# Altium footprint library My Footprint 3D.PCBLIB: 447 footprints (part 13 of 29)
Each footprint in its own frame and in the unit in brackets; x right, y up, seen from the top. Pads: shape width x height; smd on the part's side, far side on the other; paste and mask are expansions set on the pad; w line width, h text height; cw(c..) or ccw(c..) is an arc to the next point about the centre after c.
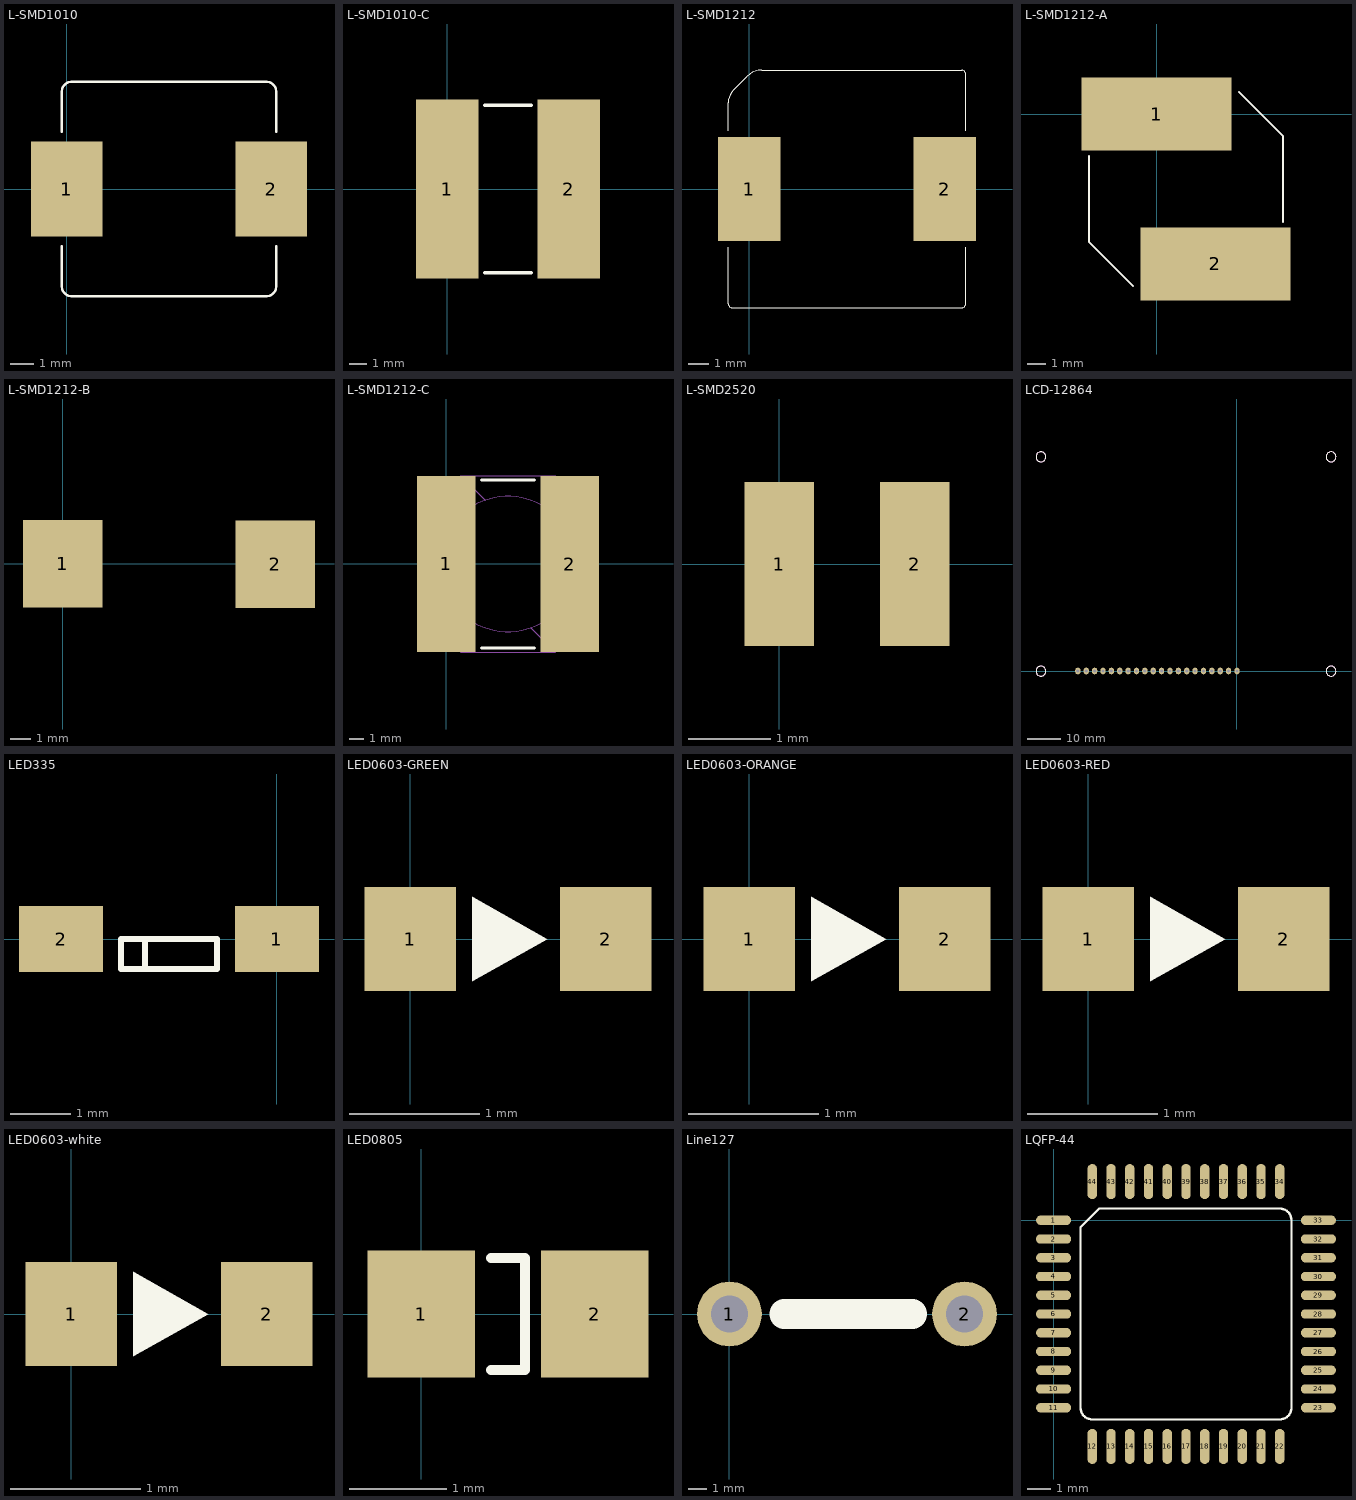
[diagram p12: the footprints below, top view; thin cyan lines are the x and y axes]

## L-SMD1010 [mm]
pads (2):
  rect 3x4 smd: 1(0,0) 2(8.6,0)
Top Overlay:
  lines w0.1: -0.2,-2.4 -0.2,-4.1 ccw(c0.2,-4.1) 0.2,-4.5 8.4,-4.5 ccw(c8.4,-4.1) 8.8,-4.1 8.8,-2.4 ; -0.2,2.4 -0.2,4.1 cw(c0.2,4.1) 0.2,4.5 8.4,4.5 cw(c8.4,4.1) 8.8,4.1 8.8,2.4
3D body: height 3, standoff 0, extent 9.35,-1.7 9.7,1.7
3D body: height 3, standoff 0, extent -1.1,-1.7 -0.75,1.7
3D body: height 4, standoff 0.1, extent -0.75,-5.05 9.35,5.05

## L-SMD1010-C [mm]
pads (2):
  rect 3.5x10 smd: 1(0,0) 2(6.8,0)
Top Overlay:
  lines w0.2: 2.1,-4.7 4.7,-4.7 ; 2.1,4.7 4.7,4.7
3D body: height 6.7, standoff 0.1, extent -0.625,-4.025 4.55,1.15
3D body: height 6.7, standoff 0.1, extent 2.25,-1.15 7.425,4.025
3D body: height 6.8, standoff 0.1, extent -1.6,-5 5.7,2.3
3D body: height 5, standoff 0.1, extent -1.6,1.15 2.25,5
3D body: height 5.2, standoff 4, extent -1.2,1.95 1.45,4.6
3D body: height 5.2, standoff 0.1, extent -1.2,2.75 0.65,4.6
3D body: height 5.2, standoff 0.1, extent 6.15,-4.6 8,-2.75
3D body: height 5.2, standoff 4, extent 5.35,-4.6 8,-1.95
3D body: height 5, standoff 0.1, extent 4.55,-5 8.4,-1.15
3D body: height 6.8, standoff 0.1, extent 1.1,-2.3 8.4,5
3D body: height 6.8, standoff 0, extent -0.396,-3.799 7.2,3.799

## L-SMD1212 [mm] "SMD  Inductance,Body 12mmX12mm"
height 10
pads (2):
  rect 3x5 smd: 1(0,0) 2(9.4,0)
Top Overlay:
  lines w0.05: -1,-2.8 -1,-5.5 ccw(c-0.8,-5.5) -0.8,-5.7 10.2,-5.7 ccw(c10.2,-5.5) 10.4,-5.5 10.4,-2.8 ; -1,2.8 -1,4.15 cw(c-0.155,4.15) -0.753,4.747 -0.083,5.417 cw(c0.6,4.734) 0.6,5.7 10.2,5.7 cw(c10.2,5.5) 10.4,5.5 10.4,2.8
3D body: height 1, standoff -0.01, extent -1.398,-6.098 10.798,6.098
3D body: height 7.5, standoff 0, extent -1.393,-6.098 10.8,6.099
3D body: height 7.51, standoff 0, extent -0.558,-5.289 10,5.29
3D body: height 7.52, standoff 0, extent 0.136,-4.591 9.3,4.591
3D body: height 1.2, standoff 0, extent -1.45,-1.75 0.05,1.75
3D body: height 1.2, standoff 0, extent 9.35,-1.75 10.85,1.75

## L-SMD1212-A [mm]
pads (2):
  rect 8.2x4 smd: 1(0,0) 2(3.2,-8.2)
Top Overlay:
  lines w0.1: -3.7,-2.3 -3.7,-7 -1.3,-9.4 ; 4.5,1.2 6.9,-1.2 6.9,-5.9
3D body: height 5.2, standoff 0.1, extent 4.8,-10.175 7.675,-7.3
3D body: height 7.7, standoff 0.1, extent -3.175,-8.875 3.275,-2.425
3D body: height 7.7, standoff 0.1, extent -0.075,-5.775 6.375,0.675
3D body: height 5, standoff 0.1, extent -4.4,-2.425 -0.075,1.9
3D body: height 5.2, standoff 5, extent -4.475,-2.175 -0.325,1.975
3D body: height 5.2, standoff 0.1, extent -4.475,-0.9 -1.6,1.975
3D body: height 5, standoff 0.1, extent 3.275,-10.1 7.6,-5.775
3D body: height 5.2, standoff 5, extent 3.525,-10.175 7.675,-6.025
3D body: height 7.8, standoff 0, extent -2.999,-8.695 6.199,0.5
3D body: height 7.7, standoff 0.1, extent -4.4,-10.1 4.8,-0.9
3D body: height 7.7, standoff 0.1, extent -1.6,-7.3 7.6,1.9

## L-SMD1212-B [mm]
pads (2):
  rect 3.8x4.2 smd: 1(0,0) 2(10.2,0)
3D body: height 2.4, standoff 0, extent 11.5,-2.1 11.9,2.1
3D body: height 0.3, standoff 0, extent 8.4,-2.1 11.9,2.1
3D body: height 0.3, standoff 0, extent -1.7,-2.1 1.8,2.1
3D body: height 2.4, standoff 0, extent -1.7,-2.1 -1.3,2.1
3D body: height 6, standoff 0.1, extent -1.3,-6.4 11.5,6.4

## L-SMD1212-C [mm]
pads (2):
  rect 4x12 smd: 1(0,0) 2(8.4,0)
Top Overlay:
  lines w0.2: 2.4,-5.7 6,-5.7 ; 2.4,5.7 6,5.7
Mechanical 1:
  circle w0.05: c4.2,0 r4.6
  lines w0.05: -0.15,1.55 -1.8,3.2 ; -0.125,1.525 -1.8,3.2 ; 5.75,-4.35 7.4,-6 ; 8.55,-1.55 10.2,-3.2 ; -1.8,3.2 1,6 ; -1.8,3.2 1,6 ; -1.8,3.2 -1.8,-3.2 1,-6 7.4,-6 ; 1,6 2.65,4.35 1,6 ; 1,6 7.4,6 10.2,3.2 10.2,-3.2 ; 7.4,-6 10.2,-3.2
3D body: height 7.7, standoff 0.1, extent -0.575,-4.775 5.875,1.675
3D body: height 7.7, standoff 0.1, extent 2.525,-1.675 8.975,4.775
3D body: height 5, standoff 0.1, extent -1.8,1.675 2.525,6
3D body: height 5.2, standoff 5, extent -1.875,1.925 2.275,6.075
3D body: height 5.2, standoff 0.1, extent -1.875,3.2 1,6.075
3D body: height 5, standoff 0.1, extent 5.875,-6 10.2,-1.675
3D body: height 5.2, standoff 5, extent 6.125,-6.075 10.275,-1.925
3D body: height 5.2, standoff 0.1, extent 7.4,-6.075 10.275,-3.2
3D body: height 7.8, standoff 0, extent -0.399,-4.595 8.799,4.6
3D body: height 7.7, standoff 0.1, extent -1.8,-6 7.4,3.2
3D body: height 7.7, standoff 0.1, extent 1,-3.2 10.2,6

## L-SMD2520 [mm]
height 1.2
pads (2):
  rect 0.85x2 smd: 1(0,0) 2(1.65,0)
3D body: height 0.9, standoff 0.4, extent -0.2,-0.875 1.875,0.875
3D body: height 1.2, standoff 0.9, extent -0.475,-1.1 2.125,1.1
3D body: height 0.4, standoff 0, extent -0.475,-1.1 2.125,1.1

## LCD-12864 [mm]
pads (20):
  oval 1.6x2 hole 1: 1(0,0) 2(-2.54,0) 3(-5.08,0) 4(-7.62,0) 5(-10.16,0) 6(-12.7,0) 7(-15.24,0) 8(-17.78,0) 9(-20.32,0) 10(-22.86,0) 11(-25.4,0) 12(-27.94,0) 13(-30.48,0) 14(-33.02,0) 15(-35.56,0) 16(-38.1,0) 17(-40.64,0) 18(-43.18,0) 19(-45.72,0) 20(-48.26,0)
Top Overlay:
  circle w0.2: c-59.46,-0.04 r1.5
  circle w0.2: c28.54,-0.04 r1.5
  circle w0.2: c28.54,64.96 r1.5
  circle w0.2: c-59.46,64.96 r1.5
Keep-Out Layer:
  circle w0.2: c-59.46,-0.04 r1.5
  circle w0.2: c28.54,-0.04 r1.5
  circle w0.2: c28.54,64.96 r1.5
  circle w0.2: c-59.46,64.96 r1.5
3D body: height 15.2, standoff 6.6, extent -54.465,32.71 24.05,58.47
3D body: height 15.2, standoff 6.6, extent -54.47,6.95 24.045,32.71
3D body: height 14.7, standoff 6.6, extent -51.71,13.21 21.29,52.21
3D body: height 6.6, standoff 5, extent -61.96,-2.54 31.04,67.46
3D body: height 6.7, standoff 4.9, extent -0.9,-1.1 0.9,1.1
3D body: height 7.7, standoff -2, extent -0.4,-0.4 0.4,0.4
3D body: height 7.7, standoff -2, extent -2.94,-0.4 -2.14,0.4
3D body: height 6.7, standoff 4.9, extent -3.44,-1.1 -1.64,1.1
3D body: height 7.7, standoff -2, extent -5.48,-0.4 -4.68,0.4
3D body: height 6.7, standoff 4.9, extent -5.98,-1.1 -4.18,1.1
3D body: height 7.7, standoff -2, extent -8.02,-0.4 -7.22,0.4
3D body: height 6.7, standoff 4.9, extent -8.52,-1.1 -6.72,1.1
3D body: height 7.7, standoff -2, extent -10.56,-0.4 -9.76,0.4
3D body: height 6.7, standoff 4.9, extent -11.06,-1.1 -9.26,1.1
3D body: height 7.7, standoff -2, extent -13.1,-0.4 -12.3,0.4
3D body: height 6.7, standoff 4.9, extent -13.6,-1.1 -11.8,1.1
3D body: height 7.7, standoff -2, extent -15.64,-0.4 -14.84,0.4
3D body: height 6.7, standoff 4.9, extent -16.14,-1.1 -14.34,1.1
3D body: height 7.7, standoff -2, extent -18.18,-0.4 -17.38,0.4
3D body: height 6.7, standoff 4.9, extent -18.68,-1.1 -16.88,1.1
3D body: height 7.7, standoff -2, extent -20.72,-0.4 -19.92,0.4
3D body: height 6.7, standoff 4.9, extent -21.22,-1.1 -19.42,1.1
3D body: height 7.7, standoff -2, extent -23.26,-0.4 -22.46,0.4
3D body: height 6.7, standoff 4.9, extent -23.76,-1.1 -21.96,1.1
3D body: height 7.7, standoff -2, extent -25.8,-0.4 -25,0.4
3D body: height 6.7, standoff 4.9, extent -26.3,-1.1 -24.5,1.1
3D body: height 7.7, standoff -2, extent -28.34,-0.4 -27.54,0.4
3D body: height 6.7, standoff 4.9, extent -28.84,-1.1 -27.04,1.1
3D body: height 7.7, standoff -2, extent -30.88,-0.4 -30.08,0.4
3D body: height 6.7, standoff 4.9, extent -31.38,-1.1 -29.58,1.1
3D body: height 7.7, standoff -2, extent -33.42,-0.4 -32.62,0.4
3D body: height 6.7, standoff 4.9, extent -33.92,-1.1 -32.12,1.1
3D body: height 7.7, standoff -2, extent -35.96,-0.4 -35.16,0.4
3D body: height 6.7, standoff 4.9, extent -36.46,-1.1 -34.66,1.1
3D body: height 7.7, standoff -2, extent -38.5,-0.4 -37.7,0.4
3D body: height 6.7, standoff 4.9, extent -39,-1.1 -37.2,1.1
3D body: height 7.7, standoff -2, extent -41.04,-0.4 -40.24,0.4
3D body: height 6.7, standoff 4.9, extent -41.54,-1.1 -39.74,1.1
3D body: height 7.7, standoff -2, extent -43.58,-0.4 -42.78,0.4
3D body: height 6.7, standoff 4.9, extent -44.08,-1.1 -42.28,1.1
3D body: height 7.7, standoff -2, extent -46.12,-0.4 -45.32,0.4
3D body: height 6.7, standoff 4.9, extent -46.62,-1.1 -44.82,1.1
3D body: height 7.7, standoff -2, extent -48.66,-0.4 -47.86,0.4
3D body: height 6.7, standoff 4.9, extent -49.16,-1.1 -47.36,1.1
3D body: height 9.6, standoff 6.6, extent 24.04,10.46 31.04,54.46

## LED335 [mm]
pads (2):
  rect 1.4x1.1 smd: 1(0,0) 2(-3.6,0)
Top Overlay:
  lines w0.1: -2.2,-0.5 -2.2,0 ; -2.6,-0.5 -2.6,0 -1,0 -1,-0.5 -2.6,-0.5
3D body: height 0.6, standoff 0.2, extent -2,-0.5 -1.6,-0.2
3D body: height 0.6, standoff 0.1, extent -3.8,-0.4 -3.2,-0.2
3D body: height 0.6, standoff 0.1, extent -0.4,-0.4 0.2,-0.2
3D body: height 0.7, standoff 0.1, extent -2.8,-1 -0.8,-0.2
3D body: height 0.8, standoff 0, extent -3.2,-1 -0.4,0.4
3D body: height 0.8, standoff 0.7, extent -3.2,-1 -0.4,0.4
3D body: height 0.2, standoff 0, extent -3.8,-0.4 -3.2,0.4
3D body: height 0.2, standoff 0, extent -0.4,-0.4 0.2,0.4
3D body: height 0.1, standoff 0, extent -3.2,-1 -0.4,0.4

## LED0603-GREEN [mm]
pads (2):
  rect 0.7x0.8 smd: 1(0,0) 2(1.5,0)
Top Overlay:
  region: 0.475,0.325 0.475,-0.325 1.05,0
3D body: height 0.38, standoff 0.32, extent 0.7,-0.042 0.962,0.307
3D body: height 0.35, standoff 0.2, extent 0.895,0.245 0.955,0.305
3D body: height 0.35, standoff 0.3, extent 0.72,-0.03 0.78,0.03
3D body: height 0.3, standoff 0.2, extent 0.65,-0.1 0.85,0.1
3D body: height 0.21, standoff 0.2, extent 0.525,-0.375 1.55,0.375
3D body: height 0.21, standoff 0.2, extent -0.05,-0.375 0.95,0.377
3D body: height 0.2, standoff 0, extent 0.75,-0.4 1.55,0.4
3D body: height 0.65, standoff 0.21, extent 0.225,-0.4 1.225,0.4
3D body: height 0.2, standoff 0, extent -0.05,-0.4 0.75,0.4

## LED0603-ORANGE [mm]
pads (2):
  rect 0.7x0.8 smd: 1(0,0) 2(1.5,0)
Top Overlay:
  region: 0.475,0.325 0.475,-0.325 1.05,0
3D body: height 0.38, standoff 0.32, extent 0.7,-0.042 0.962,0.307
3D body: height 0.35, standoff 0.2, extent 0.895,0.245 0.955,0.305
3D body: height 0.35, standoff 0.3, extent 0.72,-0.03 0.78,0.03
3D body: height 0.3, standoff 0.2, extent 0.65,-0.1 0.85,0.1
3D body: height 0.21, standoff 0.2, extent 0.525,-0.375 1.55,0.375
3D body: height 0.21, standoff 0.2, extent -0.05,-0.375 0.95,0.377
3D body: height 0.2, standoff 0, extent 0.75,-0.4 1.55,0.4
3D body: height 0.65, standoff 0.21, extent 0.225,-0.4 1.225,0.4
3D body: height 0.2, standoff 0, extent -0.05,-0.4 0.75,0.4

## LED0603-RED [mm]
pads (2):
  rect 0.7x0.8 smd: 1(0,0) 2(1.5,0)
Top Overlay:
  region: 0.475,0.325 0.475,-0.325 1.05,0
3D body: height 0.38, standoff 0.32, extent 0.7,-0.042 0.962,0.307
3D body: height 0.35, standoff 0.2, extent 0.895,0.245 0.955,0.305
3D body: height 0.35, standoff 0.3, extent 0.72,-0.03 0.78,0.03
3D body: height 0.3, standoff 0.2, extent 0.65,-0.1 0.85,0.1
3D body: height 0.21, standoff 0.2, extent 0.525,-0.375 1.55,0.375
3D body: height 0.21, standoff 0.2, extent -0.05,-0.375 0.95,0.377
3D body: height 0.2, standoff 0, extent 0.75,-0.4 1.55,0.4
3D body: height 0.65, standoff 0.21, extent 0.225,-0.4 1.225,0.4
3D body: height 0.2, standoff 0, extent -0.05,-0.4 0.75,0.4

## LED0603-white [mm]
pads (2):
  rect 0.7x0.8 smd: 1(0,0) 2(1.5,0)
Top Overlay:
  region: 0.475,0.325 0.475,-0.325 1.05,0
3D body: height 0.38, standoff 0.32, extent 0.7,-0.042 0.962,0.307
3D body: height 0.35, standoff 0.2, extent 0.895,0.245 0.955,0.305
3D body: height 0.35, standoff 0.3, extent 0.72,-0.03 0.78,0.03
3D body: height 0.3, standoff 0.2, extent 0.65,-0.1 0.85,0.1
3D body: height 0.21, standoff 0.2, extent 0.525,-0.375 1.55,0.375
3D body: height 0.21, standoff 0.2, extent -0.05,-0.375 0.95,0.377
3D body: height 0.2, standoff 0, extent 0.75,-0.4 1.55,0.4
3D body: height 0.65, standoff 0.21, extent 0.225,-0.4 1.225,0.4
3D body: height 0.2, standoff 0, extent -0.05,-0.4 0.75,0.4

## LED0805 [mm]
height 2
pads (2):
  rect 1.1x1.3 smd: 1(0,0) 2(1.778,0)
Top Overlay:
  lines w0.1: 0.714,-0.575 1.064,-0.575 1.064,0.575 0.714,0.575
3D body: height 0.31, standoff 0.3, extent 1.589,-0.7 1.764,0.7
3D body: height 0.3, standoff 0, extent -0.236,-0.7 2.014,0.7
3D body: height 0.31, standoff 0.3, extent 0.667,-0.7 2.014,0.7
3D body: height 0.31, standoff 0.3, extent -0.236,-0.7 0.592,0.7
3D body: height 0.65, standoff 0.3, extent 0.526,0.314 0.575,0.364
3D body: height 0.5, standoff 0.3, extent 0.689,-0.2 1.089,0.2
3D body: height 1, standoff 0.3, extent 0.189,-0.7 1.589,0.7
3D body: height 0.55, standoff 0.5, extent 0.79,-0.1 0.989,0.1
3D body: height 0.65, standoff 0.55, extent 0.864,-0.025 0.914,0.025
3D body: height 0.65, standoff 0.6, extent 0.525,-0.025 0.914,0.364

## Line127 [mm]
pads (2):
  round 3.5 hole 2: 1(0,0) 2(12.7,0)
Top Overlay:
  lines w1.6: 2.971,0 9.875,0

## LQFP-44 [mm] "Body 12mmX12mmX1.2mm"
height 1.2
pads (44):
  oval 1.5x0.4 smd: 1(0,0) 2(0,-0.8) 3(0,-1.6) 4(0,-2.4) 5(0,-3.2) 6(0,-4) 7(0,-4.8) 8(0,-5.6) 9(0,-6.4) 10(0,-7.2) 11(0,-8) 23(11.303,-8.001) 24(11.303,-7.201) 25(11.303,-6.401) 26(11.303,-5.601) 27(11.303,-4.801) 28(11.303,-4.001) 29(11.303,-3.201) 30(11.303,-2.401) 31(11.303,-1.601) 32(11.303,-0.801) 33(11.303,-0.001)
  oval 0.4x1.5 smd: 12(1.652,-9.652) 13(2.452,-9.652) 14(3.252,-9.652) 15(4.052,-9.652) 16(4.852,-9.652) 17(5.652,-9.652) 18(6.452,-9.652) 19(7.252,-9.652) 20(8.052,-9.652) 21(8.852,-9.652) 22(9.652,-9.652) 34(9.652,1.651) 35(8.852,1.651) 36(8.052,1.651) 37(7.252,1.651) 38(6.452,1.651) 39(5.652,1.651) 40(4.852,1.651) 41(4.052,1.651) 42(3.252,1.651) 43(2.452,1.651) 44(1.652,1.651)
Top Overlay:
  lines w0.1: 1.652,-8.501 9.651,-8.501 ccw(c9.651,-8.001) 10.152,-8.001 ; 1.652,-8.501 cw(c1.652,-8) 1.151,-8 1.151,-0.3 1.951,0.5 9.652,0.5 cw(c9.652,-0.001) 10.152,-0.001 10.152,-8
3D body: height 2.11, standoff 0.1, extent 1.5,-0.9 2.695,0.298
3D body: height 2, standoff 0.5, extent 0.749,-8.903 10.554,0.9
3D body: height 1.4, standoff 1.2, extent 1.464,0.902 1.841,1.156
3D body: height 1.4, standoff 0, extent 1.464,1.156 1.841,1.359
3D body: height 0.3, standoff 0, extent 1.464,1.359 1.841,2.045
3D body: height 0.3, standoff 0, extent 2.264,1.359 2.642,2.045
3D body: height 1.4, standoff 0, extent 2.264,1.156 2.642,1.359
3D body: height 1.4, standoff 1.2, extent 2.264,0.902 2.642,1.156
3D body: height 0.3, standoff 0, extent 3.064,1.359 3.442,2.045
3D body: height 1.4, standoff 0, extent 3.064,1.156 3.442,1.359
3D body: height 1.4, standoff 1.2, extent 3.064,0.902 3.442,1.156
3D body: height 0.3, standoff 0, extent 3.864,1.359 4.242,2.045
3D body: height 1.4, standoff 0, extent 3.864,1.156 4.242,1.359
3D body: height 1.4, standoff 1.2, extent 3.864,0.902 4.242,1.156
3D body: height 0.3, standoff 0, extent 4.664,1.359 5.042,2.045
3D body: height 1.4, standoff 0, extent 4.664,1.156 5.042,1.359
3D body: height 1.4, standoff 1.2, extent 4.664,0.902 5.042,1.156
3D body: height 0.3, standoff 0, extent 5.464,1.359 5.842,2.045
3D body: height 1.4, standoff 0, extent 5.464,1.156 5.842,1.359
3D body: height 1.4, standoff 1.2, extent 5.464,0.902 5.842,1.156
3D body: height 0.3, standoff 0, extent 6.264,1.359 6.642,2.045
3D body: height 1.4, standoff 0, extent 6.264,1.156 6.642,1.359
3D body: height 1.4, standoff 1.2, extent 6.264,0.902 6.642,1.156
3D body: height 0.3, standoff 0, extent 7.064,1.359 7.442,2.045
3D body: height 1.4, standoff 0, extent 7.064,1.156 7.442,1.359
3D body: height 1.4, standoff 1.2, extent 7.064,0.902 7.442,1.156
3D body: height 0.3, standoff 0, extent 7.876,1.372 8.254,2.057
3D body: height 1.4, standoff 0, extent 7.876,1.168 8.254,1.372
3D body: height 1.4, standoff 1.2, extent 7.876,0.914 8.254,1.168
3D body: height 0.3, standoff 0, extent 8.664,1.359 9.042,2.045
3D body: height 1.4, standoff 0, extent 8.664,1.156 9.042,1.359
3D body: height 1.4, standoff 1.2, extent 8.664,0.902 9.042,1.156
3D body: height 0.3, standoff 0, extent 9.464,1.359 9.842,2.045
3D body: height 1.4, standoff 0, extent 9.464,1.156 9.842,1.359
3D body: height 1.4, standoff 1.2, extent 9.464,0.902 9.842,1.156
3D body: height 0.3, standoff 0, extent 11.011,-0.191 11.697,0.187
3D body: height 1.4, standoff 0, extent 10.808,-0.191 11.011,0.187
3D body: height 1.4, standoff 1.2, extent 10.554,-0.191 10.808,0.187
3D body: height 0.3, standoff 0, extent 11.011,-0.991 11.697,-0.613
3D body: height 1.4, standoff 0, extent 10.808,-0.991 11.011,-0.613
3D body: height 1.4, standoff 1.2, extent 10.554,-0.991 10.808,-0.613
3D body: height 0.3, standoff 0, extent 11.011,-1.791 11.697,-1.413
3D body: height 1.4, standoff 0, extent 10.808,-1.791 11.011,-1.413
3D body: height 1.4, standoff 1.2, extent 10.554,-1.791 10.808,-1.413
3D body: height 0.3, standoff 0, extent 11.011,-2.591 11.697,-2.213
3D body: height 1.4, standoff 0, extent 10.808,-2.591 11.011,-2.213
3D body: height 1.4, standoff 1.2, extent 10.554,-2.591 10.808,-2.213
3D body: height 0.3, standoff 0, extent 11.011,-3.391 11.697,-3.013
3D body: height 1.4, standoff 0, extent 10.808,-3.391 11.011,-3.013
3D body: height 1.4, standoff 1.2, extent 10.554,-3.391 10.808,-3.013
3D body: height 0.3, standoff 0, extent 11.011,-4.191 11.697,-3.813
3D body: height 1.4, standoff 0, extent 10.808,-4.191 11.011,-3.813
3D body: height 1.4, standoff 1.2, extent 10.554,-4.191 10.808,-3.813
3D body: height 0.3, standoff 0, extent 11.011,-4.991 11.697,-4.613
3D body: height 1.4, standoff 0, extent 10.808,-4.991 11.011,-4.613
3D body: height 1.4, standoff 1.2, extent 10.554,-4.991 10.808,-4.613
3D body: height 0.3, standoff 0, extent 11.011,-5.791 11.697,-5.413
3D body: height 1.4, standoff 0, extent 10.808,-5.791 11.011,-5.413
3D body: height 1.4, standoff 1.2, extent 10.554,-5.791 10.808,-5.413
3D body: height 0.3, standoff 0, extent 11.011,-6.591 11.697,-6.213
3D body: height 1.4, standoff 0, extent 10.808,-6.591 11.011,-6.213
3D body: height 1.4, standoff 1.2, extent 10.554,-6.591 10.808,-6.213
3D body: height 0.3, standoff 0, extent 11.011,-7.391 11.697,-7.013
3D body: height 1.4, standoff 0, extent 10.808,-7.391 11.011,-7.013
3D body: height 1.4, standoff 1.2, extent 10.554,-7.391 10.808,-7.013
3D body: height 0.3, standoff 0, extent 11.011,-8.191 11.697,-7.813
3D body: height 1.4, standoff 0, extent 10.808,-8.191 11.011,-7.813
3D body: height 1.4, standoff 1.2, extent 10.554,-8.191 10.808,-7.813
3D body: height 0.3, standoff 0, extent 9.462,-10.046 9.84,-9.36
3D body: height 1.4, standoff 0, extent 9.462,-9.36 9.84,-9.157
3D body: height 1.4, standoff 1.2, extent 9.462,-9.157 9.84,-8.903
3D body: height 0.3, standoff 0, extent 8.662,-10.046 9.04,-9.36
3D body: height 1.4, standoff 0, extent 8.662,-9.36 9.04,-9.157
3D body: height 1.4, standoff 1.2, extent 8.662,-9.157 9.04,-8.903
3D body: height 0.3, standoff 0, extent 7.862,-10.046 8.24,-9.36
3D body: height 1.4, standoff 0, extent 7.862,-9.36 8.24,-9.157
3D body: height 1.4, standoff 1.2, extent 7.862,-9.157 8.24,-8.903
3D body: height 0.3, standoff 0, extent 7.062,-10.046 7.44,-9.36
3D body: height 1.4, standoff 0, extent 7.062,-9.36 7.44,-9.157
3D body: height 1.4, standoff 1.2, extent 7.062,-9.157 7.44,-8.903
3D body: height 0.3, standoff 0, extent 6.262,-10.046 6.64,-9.36
3D body: height 1.4, standoff 0, extent 6.262,-9.36 6.64,-9.157
3D body: height 1.4, standoff 1.2, extent 6.262,-9.157 6.64,-8.903
3D body: height 0.3, standoff 0, extent 5.462,-10.046 5.84,-9.36
3D body: height 1.4, standoff 0, extent 5.462,-9.36 5.84,-9.157
3D body: height 1.4, standoff 1.2, extent 5.462,-9.157 5.84,-8.903
3D body: height 0.3, standoff 0, extent 4.662,-10.046 5.04,-9.36
3D body: height 1.4, standoff 0, extent 4.662,-9.36 5.04,-9.157
3D body: height 1.4, standoff 1.2, extent 4.662,-9.157 5.04,-8.903
3D body: height 0.3, standoff 0, extent 3.862,-10.046 4.24,-9.36
3D body: height 1.4, standoff 0, extent 3.862,-9.36 4.24,-9.157
3D body: height 1.4, standoff 1.2, extent 3.862,-9.157 4.24,-8.903
3D body: height 0.3, standoff 0, extent 3.062,-10.046 3.44,-9.36
3D body: height 1.4, standoff 0, extent 3.062,-9.36 3.44,-9.157
3D body: height 1.4, standoff 1.2, extent 3.062,-9.157 3.44,-8.903
3D body: height 0.3, standoff 0, extent 2.262,-10.046 2.64,-9.36
3D body: height 1.4, standoff 0, extent 2.262,-9.36 2.64,-9.157
3D body: height 1.4, standoff 1.2, extent 2.262,-9.157 2.64,-8.903
3D body: height 0.3, standoff 0, extent 1.462,-10.046 1.84,-9.36
3D body: height 1.4, standoff 0, extent 1.462,-9.36 1.84,-9.157
3D body: height 1.4, standoff 1.2, extent 1.462,-9.157 1.84,-8.903
3D body: height 0.3, standoff 0, extent -0.394,-8.188 0.292,-7.81
3D body: height 1.4, standoff 0, extent 0.292,-8.188 0.495,-7.81
3D body: height 1.4, standoff 1.2, extent 0.495,-8.188 0.749,-7.81
3D body: height 0.3, standoff 0, extent -0.394,-7.388 0.292,-7.01
3D body: height 1.4, standoff 0, extent 0.292,-7.388 0.495,-7.01
3D body: height 1.4, standoff 1.2, extent 0.495,-7.388 0.749,-7.01
3D body: height 0.3, standoff 0, extent -0.394,-6.588 0.292,-6.21
3D body: height 1.4, standoff 0, extent 0.292,-6.588 0.495,-6.21
3D body: height 1.4, standoff 1.2, extent 0.495,-6.588 0.749,-6.21
3D body: height 0.3, standoff 0, extent -0.394,-5.788 0.292,-5.41
3D body: height 1.4, standoff 0, extent 0.292,-5.788 0.495,-5.41
3D body: height 1.4, standoff 1.2, extent 0.495,-5.788 0.749,-5.41
3D body: height 0.3, standoff 0, extent -0.394,-4.988 0.292,-4.61
3D body: height 1.4, standoff 0, extent 0.292,-4.988 0.495,-4.61
3D body: height 1.4, standoff 1.2, extent 0.495,-4.988 0.749,-4.61
3D body: height 0.3, standoff 0, extent -0.394,-4.188 0.292,-3.81
3D body: height 1.4, standoff 0, extent 0.292,-4.188 0.495,-3.81
3D body: height 1.4, standoff 1.2, extent 0.495,-4.188 0.749,-3.81
3D body: height 0.3, standoff 0, extent -0.394,-3.388 0.292,-3.01
3D body: height 1.4, standoff 0, extent 0.292,-3.388 0.495,-3.01
3D body: height 1.4, standoff 1.2, extent 0.495,-3.388 0.749,-3.01
3D body: height 0.3, standoff 0, extent -0.394,-2.588 0.292,-2.21
3D body: height 1.4, standoff 0, extent 0.292,-2.588 0.495,-2.21
3D body: height 1.4, standoff 1.2, extent 0.495,-2.588 0.749,-2.21
3D body: height 0.3, standoff 0, extent -0.394,-1.788 0.292,-1.41
3D body: height 1.4, standoff 0, extent 0.292,-1.788 0.495,-1.41
3D body: height 1.4, standoff 1.2, extent 0.495,-1.788 0.749,-1.41
3D body: height 0.3, standoff 0, extent -0.394,-0.988 0.292,-0.61
3D body: height 1.4, standoff 0, extent 0.292,-0.988 0.495,-0.61
3D body: height 1.4, standoff 1.2, extent 0.495,-0.988 0.749,-0.61
3D body: height 0.3, standoff 0, extent -0.394,-0.188 0.292,0.19
3D body: height 1.4, standoff 0, extent 0.292,-0.188 0.495,0.19
3D body: height 1.4, standoff 1.2, extent 0.495,-0.188 0.749,0.19